# Altium footprint library ACTION_非标准杂项.pcblib: 82 footprints (part 1 of 6)
Each footprint in its own frame and in the unit in brackets; x right, y up, seen from the top. Pads: shape width x height; smd on the part's side, far side on the other; paste and mask are expansions set on the pad; w line width, h text height; cw(c..) or ccw(c..) is an arc to the next point about the centre after c.
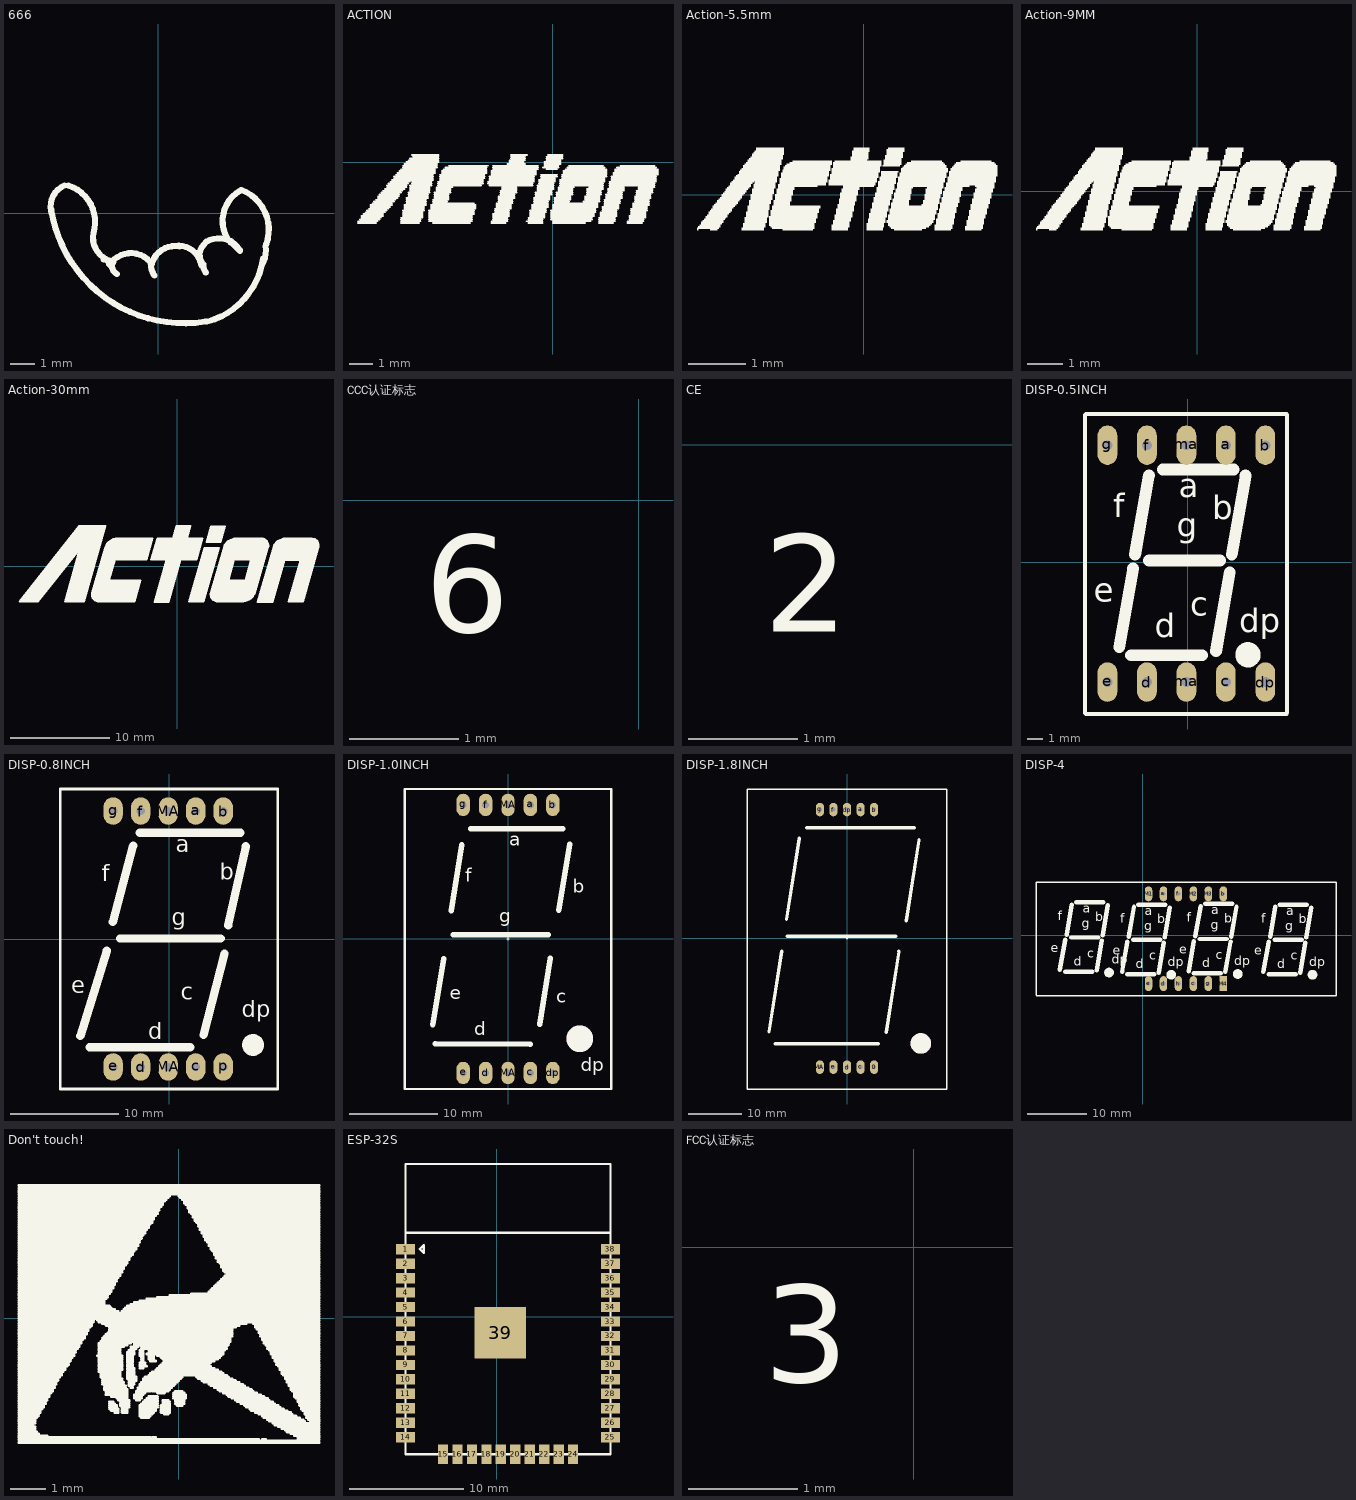
[diagram p0: the footprints below, top view; thin cyan lines are the x and y axes]

## 666 [mm]
Top Overlay:
  lines w0.254: -4.445,0.152 ccw(c1.092,1.016) 1.956,-4.521 ; -4.406,-0.067 cw(c-3.531,0.279) -3.901,1.144 ; -3.734,1.143 cw(c-4.204,-0.368) -2.692,-0.838 ccw(c-1.676,-1.016) -1.854,-2.032 ; -2.261,-1.93 -2.184,-1.93 -1.981,-2.134 ; -2.032,-1.981 -2.032,-2.134 -1.956,-2.21 ; -1.88,-2.057 ccw(c-1.549,-2.21) -1.702,-2.54 ; -1.829,-1.93 cw(c-1.13,-2.73) -0.33,-2.032 ; -0.305,-2.083 ccw(c0.559,-2.108) -0.153,-2.598 ; -0.267,-2.161 cw(c0.693,-2.357) 0.889,-1.397 ; 0.711,-1.372 cw(c0.851,-2.324) 1.803,-2.184 ; 1.88,-2.21 ccw(c2.515,-2.108) 1.986,-2.474 ; 1.88,-2.134 cw(c2.324,-1.74) 1.93,-1.295 ; 2.007,-1.194 cw(c2.527,-2.07) 3.404,-1.549 ; 2.032,-4.521 ccw(c1.245,-1.473) 4.363,-1.904 ; 2.87,-1.041 cw(c4.14,-0.33) 3.429,0.94 ; 3.023,-1.168 3.023,-1.219 3.048,-1.219 3.404,-1.575 ; 3.454,0.965 cw(c2.832,-0.699) 4.496,-1.321 ; 4.318,-2.159 ccw(c3.283,-1.55) 4.471,-1.373

## ACTION [mm]
Top Overlay:
  drawing of 272 lines, arcs and shapes, not listed

## Action-5.5mm [mm]
Top Overlay:
  drawing of 391 lines, arcs and shapes, not listed

## Action-9MM [mm]
Top Overlay:
  drawing of 391 lines, arcs and shapes, not listed

## Action-30mm [mm]
Top Overlay:
  drawing of 330 lines, arcs and shapes, not listed

## CCC认证标志 [mm]
Top Overlay:
  text "6" at -1.956,-1.499 h1.52

## CE [mm]
Top Overlay:
  text "2" at -2.896,-2.007 h1.52

## CR2032电池座 [mm]

## DISP-0.5INCH [mil]
pads (10):
  oval 50x100 hole 25: a(97,297) b(197,297) c(97,-303) d(-103,-303) dp(197,-303) e(-203,-303) f(-103,297) g(-203,297) ma(-3,-303) ma(-3,297)
Top Overlay:
  circle w40: c153,-234 r12
  lines w10: -260,-382 -260,374 ; -258,-384 251,-384 ; -258,376 251,376 ; 252,-380 252,374
  lines w30: -173,-215 -138,-15 ; -143,-235 37,-235 ; -133,20 -98,220 ; -98,5 82,5 ; -63,235 117,235 ; 72,-225 107,-25 ; 112,20 147,220
  text "c" at 7,-135 h60
  text "dp" at 131,-177 h60
  text "e" at -238,-100 h60
  text "d" at -83,-190 h60
  text "a" at -23,165 h60
  text "g" at -28,65 h60
  text "b" at 62,110 h60
  text "f" at -188,115 h60
3D body "DISP 0.5inch.STEP": height 316.25, standoff -156.19, extent -250,-375 250,375

## DISP-0.8INCH [mil]
pads (10):
  oval 70x100 hole 30: a(97,465) b(197,465) c(97,-465) d(-103,-465) e(-203,-465) f(-103,465) g(-203,465) MA(-3,-465) MA(-3,465) p(197,-465)
Top Overlay:
  circle w40: c305.31,-385 r19.68
  lines w10: -395,-545 395,-545 395,545 -395,545 -395,-545
  lines w30: -322,-352 -226,-42 ; -289,-393 77.14,-393 ; -204,62 -130,339 ; -177.68,2.24 188.47,2.24 ; -108,-478 -103,-473 ; -106.14,386 260,386 ; 125,-349 202,-53 ; 215,49 279,337
  text "b" at 185,215 h60
  text "dp" at 265,-285 h60
  text "f" at -245,210 h60
  text "e" at -355,-198 h60
  text "d" at -75,-365 h60
  text "c" at 43,-220 h60
  text "g" at 10,50 h60
  text "a" at 25,315 h60

## DISP-1.0INCH [mil]
pads (10):
  oval 60x100 hole 30: a(100,598) b(200,598) c(100,-598) d(-100,-598) dp(200,-598) e(-200,-598) f(-100,598) g(-200,598) MA(0,-598) MA(0,598)
Top Overlay:
  lines w2: -6,0 6,0 ; 0,-6 0,5
  lines w10: -461,-10 -461,10 ; -460.88,-669.58 -460.88,669 ; -459.88,-669.58 461,-669.58 461,669 -459.88,669
  lines w25: -335,-382 -287,-89 ; -324,-467 99,-470 ; -254,126 -206,419 ; -244,19 179,19 ; -167,492 245,492 ; 141,-380 189,-87 ; 227,129 275,422
  text "a" at 5,415 h60
  text "b" at 290,205 h60
  text "c" at 215,-285 h60
  text "d" at -150,-430 h60
  text "e" at -260,-270 h60
  text "f" at -190,255 h60
  text "dp" at 325,-590 h60
  text "g" at -40,75 h60
Top Overlay keep-out:
  circle w100: c320.57,-445 r9.43
3D body "DISP 1.0inch.STEP": height 414.67, standoff -156.19, extent -475,-669.29 469.88,669.29

## DISP-1.8INCH [mil]
pads (10):
  oval 60x100 hole 30: 0(200,-950) a(100,950) b(200,950) c(100,-950) d(0,-950) dp(0,950) e(-100,-950) f(-100,950) g(-200,950) MA(-200,-950)
Top Overlay:
  lines w2: -5,0 5,0 ; 0,-5 0,4
  lines w10: -736,-1111 736,-1111 736,1101.6 -736,1101.6 -736,-1111
  lines w25: -575,-691 -481,-93 ; -528,-778 230,-778 ; -446,139 -352,737 ; -442,15 359,15 ; -299,815 496,815 ; 289,-694 383,-96 ; 437,128 531,726
Top Overlay keep-out:
  circle w100: c544.39,-775 r25.61

## DISP-4 [mil]
pads (12):
  oval 50x100 hole 25: a(137,277) b(537,277) c(337,-323) d(137,-323) e(37,-323) f(237,277) g(437,-323) h(237,-323) M1(37,277) M2(337,277) M3(437,277)
  rect 50x100 hole 25: M4(537,-323)
Top Overlay:
  circle w40: c188,-264 r12
  circle w40: c-227,-249 r12
  circle w40: c633,-259 r12
  circle w40: c1133,-264 r12
  lines w10: -715,-405 1290,-405 ; -715,-401 -715,355 1290,355 1290,-404
  lines w30: -555,-230 -520,-30 ; -520,-245 -340,-245 ; -510,5 -475,205 ; -480,-15 -300,-15 ; -445,220 -265,220 ; -310,-235 -275,-35 ; -270,0 -235,200 ; -140,-245 -105,-45 ; -105,-260 75,-260 ; -95,-10 -60,190 ; -65,-30 115,-30 ; -30,205 150,205 ; 105,-250 140,-50 ; 145,-15 180,185 ; 305,-240 340,-40 ; 340,-255 520,-255 ; 350,-5 385,195 ; 380,-25 560,-25 ; 415,210 595,210 ; 550,-245 585,-45 ; 590,-10 625,190 ; 805,-245 840,-45 ; 840,-260 1020,-260 ; 850,-10 885,190 ; 880,-30 1060,-30 ; 915,205 1095,205 ; 1050,-250 1085,-50 ; 1090,-15 1125,185
  text "c" at 42,-165 h60
  text "dp" at 166,-207 h60
  text "e" at -203,-130 h60
  text "d" at -48,-220 h60
  text "a" at 12,135 h60
  text "g" at 7,35 h60
  text "b" at 97,80 h60
  text "f" at -153,85 h60
  text "c" at -373,-150 h60
  text "dp" at -209,-192 h60
  text "e" at -618,-115 h60
  text "d" at -463,-205 h60
  text "a" at -403,150 h60
  text "g" at -408,50 h60
  text "b" at -318,95 h60
  text "f" at -568,100 h60
  text "c" at 487,-160 h60
  text "dp" at 611,-202 h60
  text "e" at 242,-125 h60
  text "d" at 397,-215 h60
  text "a" at 457,140 h60
  text "g" at 452,40 h60
  text "b" at 542,85 h60
  text "f" at 292,90 h60
  text "c" at 987,-165 h60
  text "dp" at 1111,-207 h60
  text "e" at 742,-130 h60
  text "d" at 897,-220 h60
  text "a" at 957,135 h60
  text "g" at 952,35 h60
  text "b" at 1042,80 h60
  text "f" at 792,85 h60
3D body "DISP 4x7.STEP": height 314.96, standoff -137.8, extent -704.15,-396.01 1276.16,352.02

## Don't touch! [mm]
Top Overlay:
  drawing of 472 lines, arcs and shapes, not listed

## ESP-32S [mm]
pads (39):
  rect 1.7x0.9 smd: 1(-8.009,5.937) 2(-8.009,4.667) 3(-8.009,3.397) 4(-8.009,2.127) 5(-8.009,0.857) 6(-8.009,-0.413) 7(-8.009,-1.683) 8(-8.009,-2.953) 9(-8.009,-4.223) 10(-8.009,-5.493) 11(-8.009,-6.763) 12(-8.009,-8.033) 13(-8.009,-9.303) 14(-8.009,-10.573) 25(9.991,-10.573) 26(9.991,-9.303) 27(9.991,-8.033) 28(9.991,-6.763) 29(9.991,-5.493) 30(9.991,-4.223) 31(9.991,-2.953) 32(9.991,-1.683) 33(9.991,-0.413) 34(9.991,0.857) 35(9.991,2.127) 36(9.991,3.397) 37(9.991,4.667) 38(9.991,5.937)
  rect 0.9x1.7 smd: 15(-4.719,-12.083) 16(-3.449,-12.083) 17(-2.179,-12.083) 18(-0.909,-12.083) 19(0.361,-12.083) 20(1.631,-12.083) 21(2.901,-12.083) 22(4.171,-12.083) 23(5.441,-12.083) 24(6.711,-12.083)
  rect 4.5x4.5 smd: 39(0.311,-1.403)
Top Overlay:
  lines w0.2: -8.009,7.377 9.991,7.377 ; -8.009,-12.073 -8.009,13.427 9.991,13.427 9.991,-12.073 -8.009,-12.073 ; -6.759,5.957 -6.409,5.607 -6.409,6.307 -6.759,5.957

## FCC认证标志 [mm]
Top Overlay:
  text "3" at -1.372,-1.524 h1.52